# Altium footprint library FootprintHole.PcbLib: 100 footprints (part 2 of 7)
Each footprint in its own frame and in the unit in brackets; x right, y up, seen from the top. Pads: shape width x height; smd on the part's side, far side on the other; paste and mask are expansions set on the pad; w line width, h text height; cw(c..) or ccw(c..) is an arc to the next point about the centre after c.
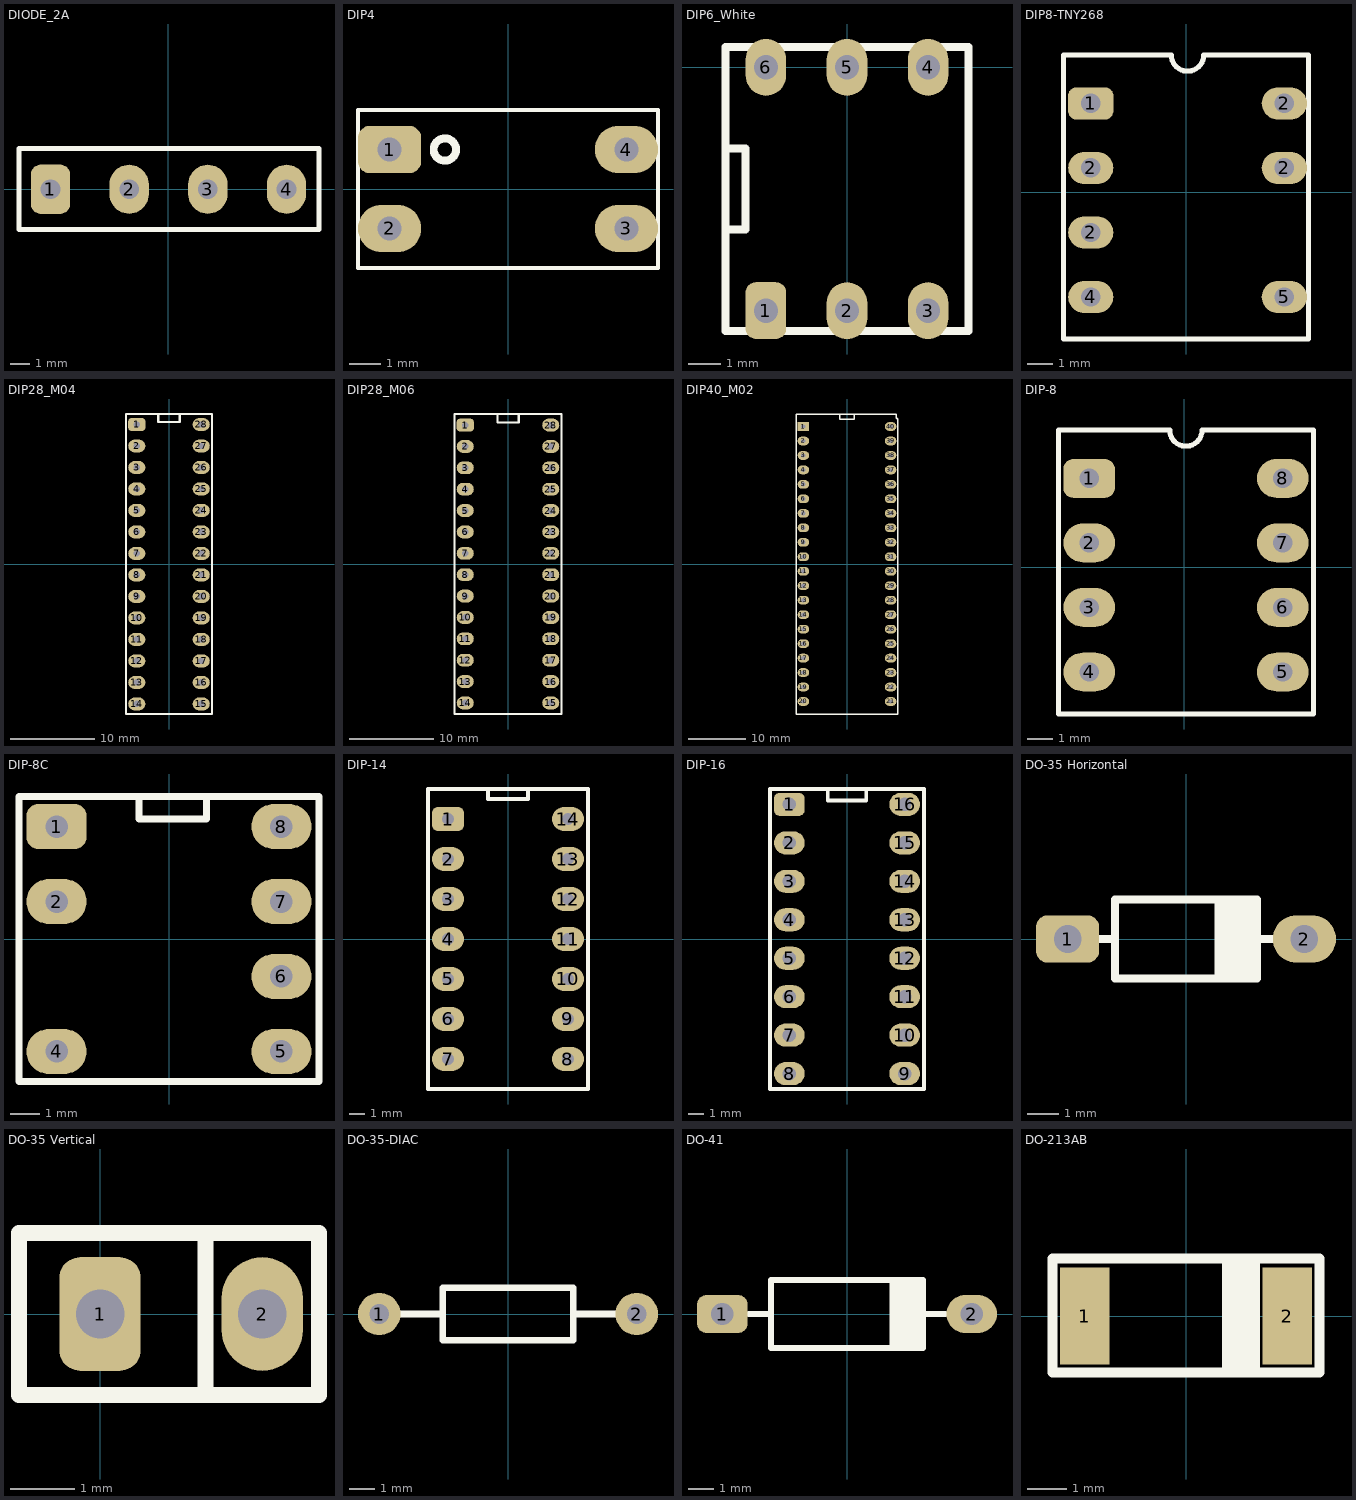
[diagram p1: the footprints below, top view; thin cyan lines are the x and y axes]

## DIODE_2A [mm]
pads (4):
  rrect50% 2x2.5 hole 1: 1(-5.975,0)
  oval 2x2.5 hole 1: 2(-1.975,0) 3(2.025,0) 4(6.025,0)
Top Overlay:
  lines w0.254: -7.575,-2.05 -7.575,2.075 7.675,2.075 7.675,-2.05 -7.575,-2.05
3D body "Diode_Bridge.STEP": height 11, standoff -9, extent -7.475,-1.9 7.525,1.9

## DIP4 [mil]
pads (4):
  rrect50% 80x60 hole 30: 1(-150,50)
  oval 80x60 hole 30: 2(-150,-50) 3(150,-50) 4(150,50)
Top Overlay:
  circle w10: c-80,50 r14.14
  lines w5: -137.8,-100 137.8,-100 ; -137.8,100 137.8,100 ; -190,-100 190,-100 190,100 -190,100 -190,-100
3D body "User Library-DIP4-7_62-2_54.STEP": height 169.29, standoff -106.3, extent -155.12,-90.35 155.12,90.37

## DIP6_White [mil]
pads (6):
  rrect50% 50x70 hole 30: 1(-100,-300)
  oval 50x70 hole 30: 2(0,-300) 3(100,-300) 4(100,0) 5(0,0) 6(-100,0)
Top Overlay:
  lines w9.84: -150,-200 -125,-200 -125,-100 -150,-100 ; -150,-325 -150,25 150,25 150,-325 -150,-325
3D body "User Library-DIP6-White.STEP": height 208.66, standoff -78.74, extent -139.76,-304.92 140.55,4.92

## DIP8-TNY268 [mil]
pads (7):
  rrect50% 70x50 hole 30: 1(-147.64,137.8)
  oval 70x50 hole 30: 2(-147.64,-62.2) 2(-147.64,37.8) 2(152.36,37.8) 2(152.36,137.8) 4(-147.64,-162.2) 5(152.36,-162.2)
Top Overlay:
  lines w7.87: -190,-227.36 190,-227.36 190,212.6 27.36,212.6 cw(c2.36,212.6) -22.64,212.6 -190,212.6 -190,-227.36
3D body "User Library-DIP8-300-metric.STEP": height 177.17, standoff -137.8, extent -149.82,-220.47 155.72,204.72

## DIP28_M04 [mil]
pads (28):
  rrect50% 80x60 hole 30: 1(-149.61,650)
  oval 80x60 hole 30: 2(-149.61,550) 3(-149.61,450) 4(-149.61,350) 5(-149.61,250) 6(-149.61,150) 7(-149.61,50) 8(-149.61,-50) 9(-149.61,-150) 10(-149.61,-250) 11(-149.61,-350) 12(-149.61,-450) 13(-149.61,-550) 14(-149.61,-650) 15(149.61,-650) 16(149.61,-550) 17(149.61,-450) 18(149.61,-350) 19(149.61,-250) 20(149.61,-150) 21(149.61,-50) 22(149.61,50) 23(149.61,150) 24(149.61,250) 25(149.61,350) 26(149.61,450) 27(149.61,550) 28(149.61,650)
Top Overlay:
  lines w10: -49.72,697.83 -49.72,661.42 50.28,661.42 50.28,697.83 ; -200,-696.85 -200,698.82 200,698.82 200,-696.85 -200,-696.85
3D body "User Library-DIP-28P-M04.STEP": height 204.72, standoff -118.11, extent -153.35,-696.85 156.5,696.85

## DIP28_M06 [mil]
pads (28):
  rrect50% 80x60 hole 30: 1(-200,650)
  oval 80x60 hole 30: 2(-200,550) 3(-200,450) 4(-200,350) 5(-200,250) 6(-200,150) 7(-200,50) 8(-200,-50) 9(-200,-150) 10(-200,-250) 11(-200,-350) 12(-200,-450) 13(-200,-550) 14(-200,-650) 15(200,-650) 16(200,-550) 17(200,-450) 18(200,-350) 19(200,-250) 20(200,-150) 21(200,-50) 22(200,50) 23(200,150) 24(200,250) 25(200,350) 26(200,450) 27(200,550) 28(200,650)
Top Overlay:
  lines w10: -49.72,697.83 -49.72,661.42 50.28,661.42 50.28,697.83 ; -250,-701.77 250,-701.77 250,701.77 -250,701.77 -250,-701.77
3D body "User Library-DIP-28P-M06.STEP": height 204.72, standoff -118.11, extent -205.12,-696.85 204.72,696.85

## DIP40_M02 [mil]
pads (40):
  rect 80x60 hole 30: 1(-301.18,950)
  oval 80x60 hole 30: 2(-301.18,850) 3(-301.18,750) 4(-301.18,650) 5(-301.18,550) 6(-301.18,450) 7(-301.18,350) 8(-301.18,250) 9(-301.18,150) 10(-301.18,50) 11(-301.18,-50) 12(-301.18,-150) 13(-301.18,-250) 14(-301.18,-350) 15(-301.18,-450) 16(-301.18,-550) 17(-301.18,-650) 18(-301.18,-750) 19(-301.18,-850) 20(-301.18,-950) 21(301.18,-950) 22(301.18,-850) 23(301.18,-750) 24(301.18,-650) 25(301.18,-550) 26(301.18,-450) 27(301.18,-350) 28(301.18,-250) 29(301.18,-150) 30(301.18,-50) 31(301.18,50) 32(301.18,150) 33(301.18,250) 34(301.18,350) 35(301.18,450) 36(301.18,550) 37(301.18,650) 38(301.18,750) 39(301.18,850) 40(301.18,950)
Top Overlay:
  lines w10: -50,1036.42 -50,1000 50,1000 50,1036.42 ; -350,-1036.42 -350,1036.42 339.57,1036.42 339.57,1009.84 350,999.41 350,-1036.42 -350,-1036.42
3D body "User Library-DIP-40P-M02.STEP": height 196.85, standoff -118.11, extent -304.13,-1031.69 305.72,1031.3

## DIP-8 [mil]
pads (8):
  rrect50% 80x60 hole 30: 1(-147.64,137.8)
  oval 80x60 hole 30: 2(-147.64,37.8) 3(-147.64,-62.2) 4(-147.64,-162.2) 5(152.36,-162.2) 6(152.36,-62.2) 7(152.36,37.8) 8(152.36,137.8)
Top Overlay:
  lines w7.87: -195,-227.36 -195,212.6 -22.64,212.6 ccw(c2.36,212.6) 27.36,212.6 200,212.6 200,-227.36 -195,-227.36
3D body "User Library-DIP8-300-metric.STEP": height 177.17, standoff -137.8, extent -149.82,-220.47 155.72,204.72

## DIP-8C [mil]
pads (7):
  rrect50% 80x60 hole 30: 1(-150,150)
  oval 80x60 hole 30: 2(-150,50) 4(-150,-150) 5(150,-150) 6(150,-50) 7(150,50) 8(150,150)
Top Overlay:
  lines w9.84: -40,190 -40,160 50,160 50,190 ; -200,-190 -200,190 200,190 200,-190 -200,-190
3D body "PDIP-8C_Assembly.stp": height 161.56, standoff -138.44, extent -155.27,-193.5 156.15,193.51

## DIP-14 [mil]
pads (14):
  rrect50% 80x60 hole 30: 1(-150,300)
  oval 80x60 hole 30: 2(-150,200) 3(-150,100) 4(-150,0) 5(-150,-100) 6(-150,-200) 7(-150,-300) 8(150,-300) 9(150,-200) 10(150,-100) 11(150,0) 12(150,100) 13(150,200) 14(150,300)
Top Overlay:
  lines w10: -50,375 -50,350 50,350 50,371.94 ; -200,-375 -200,375 200,375 200,-375 -200,-375
3D body "CircuitWorks-DIP-14.STEP": height 149.45, standoff -125.35, extent -157.48,-375 157.49,375

## DIP-16 [mil]
pads (16):
  rrect50% 80x60 hole 35: 1(-150,350)
  oval 80x60 hole 35: 2(-150,250) 3(-150,150) 4(-150,50) 5(-150,-50) 6(-150,-150) 7(-150,-250) 8(-150,-350) 9(150,-350) 10(150,-250) 11(150,-150) 12(150,-50) 13(150,50) 14(150,150) 15(150,250) 16(150,350)
Top Overlay:
  lines w10: -50,390 -50,360 50,360 50,390 ; -200,-390 -200,390 200,390 200,-390 -200,-390
3D body "User Library-DIP-16P-M03.STEP": height 183.46, standoff -118.11, extent -154.92,-381.9 154.93,381.88

## DO-35 Horizontal [mil]
pads (2):
  rrect50% 80x60 hole 35: 1(-150,0)
  oval 80x60 hole 35: 2(150,0)
Top Overlay:
  rectangle: 35.79,-50 85,50
  lines w10: -110,0 -90,0 ; 90,0 110,0 ; -90,-50 -90,50 90,50 90,-50 -90,-50
3D body "User Library-Zener 1W.STEP": height 111.56, standoff -59.06, extent -165.49,-52.49 165.51,52.51

## DO-35 Vertical [mil]
pads (2):
  rrect50% 50x70 hole 30: 1(0,0)
  oval 50x70 hole 30: 2(100,0)
Top Overlay:
  lines w10: 65,-50 65,50 ; -50,-50 -50,50 135,50 135,-50 -50,-50
3D body "User Library-Zener 1W_Stand.STEP": height 255.46, standoff -75, extent -52.5,-52.5 115.5,52.5

## DO-35-DIAC [mil]
pads (2):
  round 65 hole 30: 1(-197,0) 2(197,0)
Top Overlay:
  lines w10: -165,0 -100,0 ; 100,0 165,0 ; -100,-40 -100,40 100,40 100,-40 -100,-40
3D body "DO-35.STEP": height 109.39, standoff -127.03, extent -208.66,-38.74 208.66,40

## DO-41 [mil]
pads (2):
  rrect50% 80x60 hole 35: 1(-196.85,0)
  oval 80x60 hole 35: 2(196.85,0)
Top Overlay:
  rectangle: 66.85,-49.7 120,53.64
  lines w10: -155,0 -120,0 ; 120,0 155,0 ; -120,-53.64 -120,53.64 120,53.64 120,-53.64 -120,-53.64
3D body "User Library-DO-41 10mm.STEP": height 132.36, standoff -78.74, extent -213.78,-53.64 213.78,53.64

## DO-213AB [mm]
pads (2):
  rect 1.27x2.5 smd: 1(-2.6,0) 2(2.6,0)
Top Overlay:
  rectangle: 0.921,-1.397 1.905,1.553
  lines w0.254: -3.429,-1.45 3.429,-1.45 3.429,1.475 -3.429,1.475 -3.429,-1.45
3D body "MelfDiode.stp": height 2.64, standoff 0.04, extent -2.6,-1.3 2.6,1.3